# Altium integrated library Lattice CPLD ispLSI.IntLib: 471 symbols (part 9 of 26) (continued)
## ispLSI2096V-60LT128 (continued)

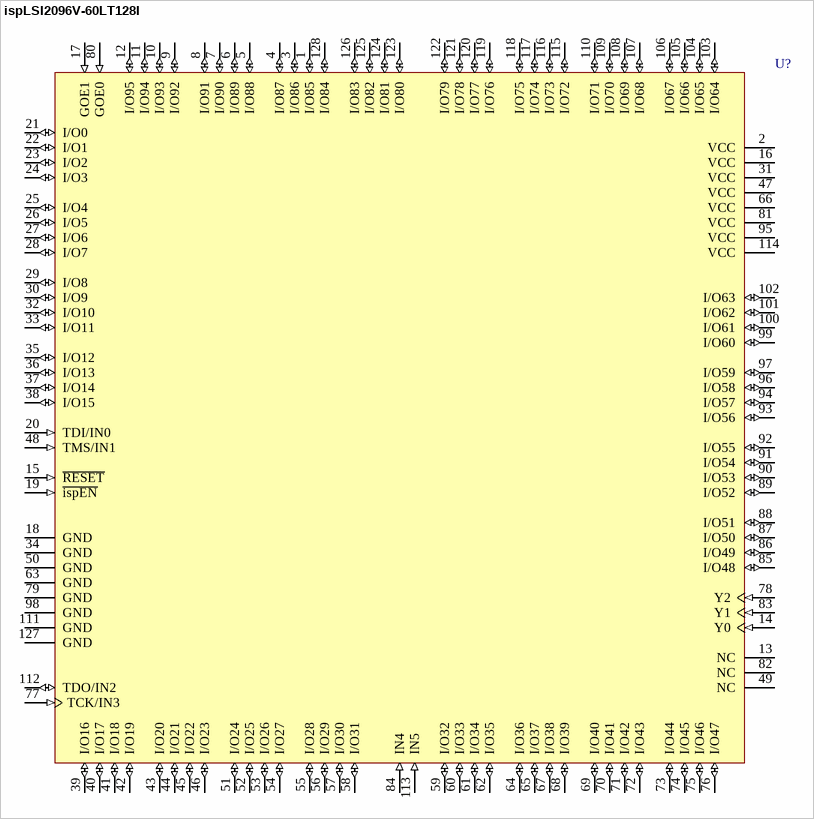
[diagram p70: symbol ispLSI2096V-60LT128I]

## ispLSI2096V-60LT128I
designator U?
3.3V High-Density Programmable Logic; Published: 23-Sep-2002; LatestRevisionDate: 13-Apr-2006; LatestRevisionNote: IPC-7351 Footprint Added.; DatasheetVersion: Feb-2000; PackageVersion: Aug-2005; PackageReference: TQFP128; Publisher: Altium Limited; PackageDescription: 128-Pin Thin Quad Flat Pack 0.4 mm Pitch; ComponentLink1Description: Manufacturer Link; ComponentLink1URL: http://www.latticesemi.com/products/mature/index.cfm; ComponentLink2Description: Datasheet; ComponentLink2URL: http://www.latticesemi.com/lit/docs/datasheets/cpld/2096v.pdf
footprint TQFP128_N (Thin QFP, 128-Leads, Body 14x14mm, Pitch 0.4mm, IPC Medium Density)
footprint TQFP128_L (Thin QFP, 128-Leads, Body 14x14mm, Pitch 0.4mm, IPC High Density)
footprint TQFP128_M (Thin QFP, 128-Leads, Body 14x14mm, Pitch 0.4mm, IPC Low Density)
3D model 2096V-TQFP128 (128-Pin Thin Quad Flat Pack 0.4 mm Pitch)
pins: 1 I/O85 (io), 2 VCC (power), 3 I/O86 (io), 4 I/O87 (io), 5 I/O88 (io), 6 I/O89 (io), 7 I/O90 (io), 8 I/O91 (io), 9 I/O92 (io), 10 I/O93 (io), 11 I/O94 (io), 12 I/O95 (io), 13 NC, 14 Y0 (in), 15 ~{RESET} (in), 16 VCC (power), 17 GOE1 (in), 18 GND (power), 19 ~{ispEN} (in), 20 TDI/IN0 (in), 21 I/O0 (io), 22 I/O1 (io), 23 I/O2 (io), 24 I/O3 (io), 25 I/O4 (io), 26 I/O5 (io), 27 I/O6 (io), 28 I/O7 (io), 29 I/O8 (io), 30 I/O9 (io), 31 VCC (power), 32 I/O10 (io), 33 I/O11 (io), 34 GND (power), 35 I/O12 (io), 36 I/O13 (io), 37 I/O14 (io), 38 I/O15 (io), 39 I/O16 (io), 40 I/O17 (io), 41 I/O18 (io), 42 I/O19 (io), 43 I/O20 (io), 44 I/O21 (io), 45 I/O22 (io), 46 I/O23 (io), 47 VCC (power), 48 TMS/IN1 (in), 49 NC, 50 GND (power), 51 I/O24 (io), 52 I/O25 (io), 53 I/O26 (io), 54 I/O27 (io), 55 I/O28 (io), 56 I/O29 (io), 57 I/O30 (io), 58 I/O31 (io), 59 I/O32 (io), 60 I/O33 (io), 61 I/O34 (io), 62 I/O35 (io), 63 GND (power), 64 I/O36 (io), 65 I/O37 (io), 66 VCC (power), 67 I/O38 (io), 68 I/O39 (io), 69 I/O40 (io), 70 I/O41 (io), 71 I/O42 (io), 72 I/O43 (io), 73 I/O44 (io), 74 I/O45 (io), 75 I/O46 (io), 76 I/O47 (io), 77 TCK/IN3 (in), 78 Y2 (in), 79 GND (power), 80 GOE0 (in), 81 VCC (power), 82 NC, 83 Y1 (in), 84 IN4 (in), 85 I/O48 (io), 86 I/O49 (io), 87 I/O50 (io), 88 I/O51 (io), 89 I/O52 (io), 90 I/O53 (io), 91 I/O54 (io), 92 I/O55 (io), 93 I/O56 (io), 94 I/O57 (io), 95 VCC (power), 96 I/O58 (io), 97 I/O59 (io), 98 GND (power), 99 I/O60 (io), 100 I/O61 (io), 101 I/O62 (io), 102 I/O63 (io), 103 I/O64 (io), 104 I/O65 (io), 105 I/O66 (io), 106 I/O67 (io), 107 I/O68 (io), 108 I/O69 (io), 109 I/O70 (io), 110 I/O71 (io), 111 GND (power), 112 TDO/IN2 (io), 113 IN5 (in), 114 VCC (power), 115 I/O72 (io), 116 I/O73 (io), 117 I/O74 (io), 118 I/O75 (io), 119 I/O76 (io), 120 I/O77 (io), 121 I/O78 (io), 122 I/O79 (io), 123 I/O80 (io), 124 I/O81 (io), 125 I/O82 (io), 126 I/O83 (io), 127 GND (power), 128 I/O84 (io)

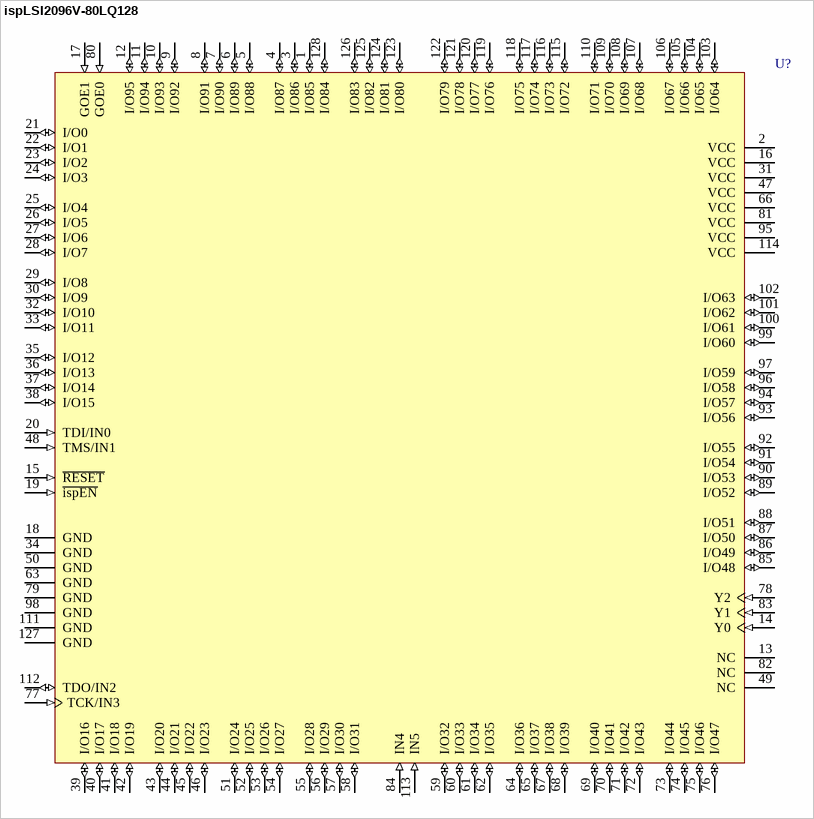
[diagram p71: symbol ispLSI2096V-80LQ128]

## ispLSI2096V-80LQ128
designator U?
3.3V High-Density Programmable Logic; Published: 23-Sep-2002; LatestRevisionDate: 13-Apr-2006; LatestRevisionNote: IPC-7351 Footprint Added.; DatasheetVersion: Feb-2000; PackageVersion: pkg_32, Aug-2005; PackageReference: PQFP128; Publisher: Altium Limited; PackageDescription: 128-Pin Quad Flat Pack 0.8 mm Pitch; Code_IPC: QFP80P3120X3120-128; ComponentLink1Description: Manufacturer Link; ComponentLink1URL: http://www.latticesemi.com/products/mature/index.cfm; ComponentLink2Description: Datasheet; ComponentLink2URL: http://www.latticesemi.com/lit/docs/datasheets/cpld/2096v.pdf
footprint PQFP128_N (QFP, 128-Leads, Body 28x28mm, Pitch 0.8mm, IPC Medium Density)
footprint PQFP128_L (QFP, 128-Leads, Body 28x28mm, Pitch 0.8mm, IPC High Density)
footprint PQFP128_M (QFP, 128-Leads, Body 28x28mm, Pitch 0.8mm, IPC Low Density)
3D model 2096V-PQFP128 (128-Pin Quad Flat Pack 0.8 mm Pitch)
pins: 1 I/O85 (io), 2 VCC (power), 3 I/O86 (io), 4 I/O87 (io), 5 I/O88 (io), 6 I/O89 (io), 7 I/O90 (io), 8 I/O91 (io), 9 I/O92 (io), 10 I/O93 (io), 11 I/O94 (io), 12 I/O95 (io), 13 NC, 14 Y0 (in), 15 ~{RESET} (in), 16 VCC (power), 17 GOE1 (in), 18 GND (power), 19 ~{ispEN} (in), 20 TDI/IN0 (in), 21 I/O0 (io), 22 I/O1 (io), 23 I/O2 (io), 24 I/O3 (io), 25 I/O4 (io), 26 I/O5 (io), 27 I/O6 (io), 28 I/O7 (io), 29 I/O8 (io), 30 I/O9 (io), 31 VCC (power), 32 I/O10 (io), 33 I/O11 (io), 34 GND (power), 35 I/O12 (io), 36 I/O13 (io), 37 I/O14 (io), 38 I/O15 (io), 39 I/O16 (io), 40 I/O17 (io), 41 I/O18 (io), 42 I/O19 (io), 43 I/O20 (io), 44 I/O21 (io), 45 I/O22 (io), 46 I/O23 (io), 47 VCC (power), 48 TMS/IN1 (in), 49 NC, 50 GND (power), 51 I/O24 (io), 52 I/O25 (io), 53 I/O26 (io), 54 I/O27 (io), 55 I/O28 (io), 56 I/O29 (io), 57 I/O30 (io), 58 I/O31 (io), 59 I/O32 (io), 60 I/O33 (io), 61 I/O34 (io), 62 I/O35 (io), 63 GND (power), 64 I/O36 (io), 65 I/O37 (io), 66 VCC (power), 67 I/O38 (io), 68 I/O39 (io), 69 I/O40 (io), 70 I/O41 (io), 71 I/O42 (io), 72 I/O43 (io), 73 I/O44 (io), 74 I/O45 (io), 75 I/O46 (io), 76 I/O47 (io), 77 TCK/IN3 (in), 78 Y2 (in), 79 GND (power), 80 GOE0 (in), 81 VCC (power), 82 NC, 83 Y1 (in), 84 IN4 (in), 85 I/O48 (io), 86 I/O49 (io), 87 I/O50 (io), 88 I/O51 (io), 89 I/O52 (io), 90 I/O53 (io), 91 I/O54 (io), 92 I/O55 (io), 93 I/O56 (io), 94 I/O57 (io), 95 VCC (power), 96 I/O58 (io), 97 I/O59 (io), 98 GND (power), 99 I/O60 (io), 100 I/O61 (io), 101 I/O62 (io), 102 I/O63 (io), 103 I/O64 (io), 104 I/O65 (io), 105 I/O66 (io), 106 I/O67 (io), 107 I/O68 (io), 108 I/O69 (io), 109 I/O70 (io), 110 I/O71 (io), 111 GND (power), 112 TDO/IN2 (io), 113 IN5 (in), 114 VCC (power), 115 I/O72 (io), 116 I/O73 (io), 117 I/O74 (io), 118 I/O75 (io), 119 I/O76 (io), 120 I/O77 (io), 121 I/O78 (io), 122 I/O79 (io), 123 I/O80 (io), 124 I/O81 (io), 125 I/O82 (io), 126 I/O83 (io), 127 GND (power), 128 I/O84 (io)

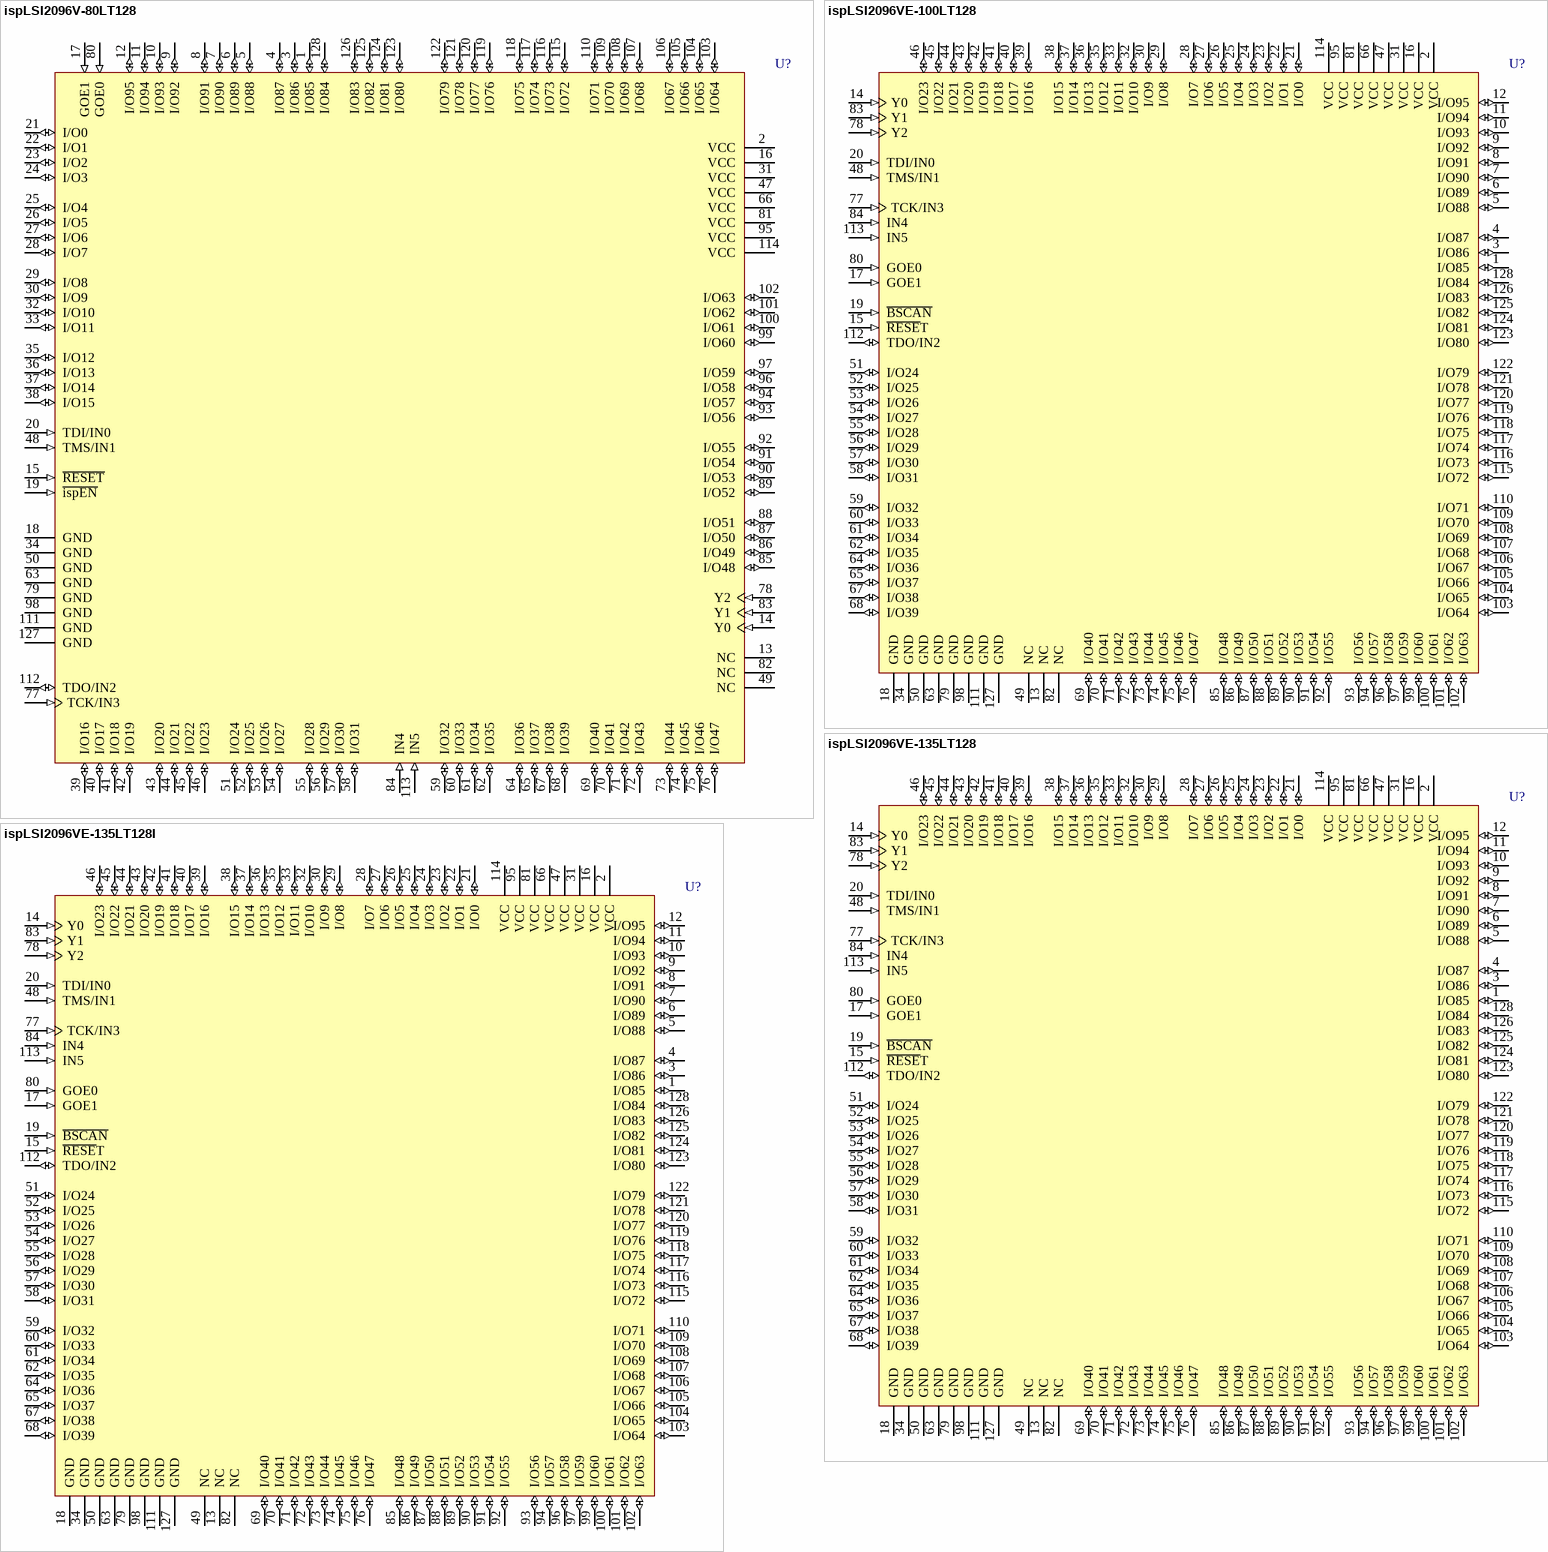
[diagram p72: symbols ispLSI2096V-80LT128 to ispLSI2096VE-135LT128I]

## ispLSI2096V-80LT128
designator U?
3.3V High-Density Programmable Logic; Published: 23-Sep-2002; LatestRevisionDate: 13-Apr-2006; LatestRevisionNote: IPC-7351 Footprint Added.; DatasheetVersion: Feb-2000; PackageVersion: Aug-2005; PackageReference: TQFP128; Publisher: Altium Limited; PackageDescription: 128-Pin Thin Quad Flat Pack 0.4 mm Pitch; ComponentLink1Description: Manufacturer Link; ComponentLink1URL: http://www.latticesemi.com/products/mature/index.cfm; ComponentLink2Description: Datasheet; ComponentLink2URL: http://www.latticesemi.com/lit/docs/datasheets/cpld/2096v.pdf
footprint TQFP128_N (Thin QFP, 128-Leads, Body 14x14mm, Pitch 0.4mm, IPC Medium Density)
footprint TQFP128_L (Thin QFP, 128-Leads, Body 14x14mm, Pitch 0.4mm, IPC High Density)
footprint TQFP128_M (Thin QFP, 128-Leads, Body 14x14mm, Pitch 0.4mm, IPC Low Density)
3D model 2096V-TQFP128 (128-Pin Thin Quad Flat Pack 0.4 mm Pitch)
pins: 1 I/O85 (io), 2 VCC (power), 3 I/O86 (io), 4 I/O87 (io), 5 I/O88 (io), 6 I/O89 (io), 7 I/O90 (io), 8 I/O91 (io), 9 I/O92 (io), 10 I/O93 (io), 11 I/O94 (io), 12 I/O95 (io), 13 NC, 14 Y0 (in), 15 ~{RESET} (in), 16 VCC (power), 17 GOE1 (in), 18 GND (power), 19 ~{ispEN} (in), 20 TDI/IN0 (in), 21 I/O0 (io), 22 I/O1 (io), 23 I/O2 (io), 24 I/O3 (io), 25 I/O4 (io), 26 I/O5 (io), 27 I/O6 (io), 28 I/O7 (io), 29 I/O8 (io), 30 I/O9 (io), 31 VCC (power), 32 I/O10 (io), 33 I/O11 (io), 34 GND (power), 35 I/O12 (io), 36 I/O13 (io), 37 I/O14 (io), 38 I/O15 (io), 39 I/O16 (io), 40 I/O17 (io), 41 I/O18 (io), 42 I/O19 (io), 43 I/O20 (io), 44 I/O21 (io), 45 I/O22 (io), 46 I/O23 (io), 47 VCC (power), 48 TMS/IN1 (in), 49 NC, 50 GND (power), 51 I/O24 (io), 52 I/O25 (io), 53 I/O26 (io), 54 I/O27 (io), 55 I/O28 (io), 56 I/O29 (io), 57 I/O30 (io), 58 I/O31 (io), 59 I/O32 (io), 60 I/O33 (io), 61 I/O34 (io), 62 I/O35 (io), 63 GND (power), 64 I/O36 (io), 65 I/O37 (io), 66 VCC (power), 67 I/O38 (io), 68 I/O39 (io), 69 I/O40 (io), 70 I/O41 (io), 71 I/O42 (io), 72 I/O43 (io), 73 I/O44 (io), 74 I/O45 (io), 75 I/O46 (io), 76 I/O47 (io), 77 TCK/IN3 (in), 78 Y2 (in), 79 GND (power), 80 GOE0 (in), 81 VCC (power), 82 NC, 83 Y1 (in), 84 IN4 (in), 85 I/O48 (io), 86 I/O49 (io), 87 I/O50 (io), 88 I/O51 (io), 89 I/O52 (io), 90 I/O53 (io), 91 I/O54 (io), 92 I/O55 (io), 93 I/O56 (io), 94 I/O57 (io), 95 VCC (power), 96 I/O58 (io), 97 I/O59 (io), 98 GND (power), 99 I/O60 (io), 100 I/O61 (io), 101 I/O62 (io), 102 I/O63 (io), 103 I/O64 (io), 104 I/O65 (io), 105 I/O66 (io), 106 I/O67 (io), 107 I/O68 (io), 108 I/O69 (io), 109 I/O70 (io), 110 I/O71 (io), 111 GND (power), 112 TDO/IN2 (io), 113 IN5 (in), 114 VCC (power), 115 I/O72 (io), 116 I/O73 (io), 117 I/O74 (io), 118 I/O75 (io), 119 I/O76 (io), 120 I/O77 (io), 121 I/O78 (io), 122 I/O79 (io), 123 I/O80 (io), 124 I/O81 (io), 125 I/O82 (io), 126 I/O83 (io), 127 GND (power), 128 I/O84 (io)

## ispLSI2096VE-100LT128
designator U?
3.3V In-System Programmable SuperFAST High Density PLD; Published: 17-Jul-2002; LatestRevisionDate: 13-Apr-2006; LatestRevisionNote: IPC-7351 Footprint Added.; DatasheetVersion: Jan-2001; PackageVersion: Aug-2005; PackageReference: TQFP128; Publisher: Altium Limited; PackageDescription: 128-Pin Thin Quad Flat Pack 0.4 mm Pitch; ComponentLink1Description: Manufacturer Link; ComponentLink1URL: http://www.latticesemi.com/products/mature/index.cfm; ComponentLink2Description: Datasheet; ComponentLink2URL: http://www.latticesemi.com/account/_download.cfm?AMID=710
footprint TQFP128_N (Thin QFP, 128-Leads, Body 14x14mm, Pitch 0.4mm, IPC Medium Density)
footprint TQFP128_L (Thin QFP, 128-Leads, Body 14x14mm, Pitch 0.4mm, IPC High Density)
footprint TQFP128_M (Thin QFP, 128-Leads, Body 14x14mm, Pitch 0.4mm, IPC Low Density)
3D model 2096VE-TQFP128 (128-Pin Thin Quad Flat Pack 0.4 mm Pitch)
pins: 1 I/O85 (io), 2 VCC (power), 3 I/O86 (io), 4 I/O87 (io), 5 I/O88 (io), 6 I/O89 (io), 7 I/O90 (io), 8 I/O91 (io), 9 I/O92 (io), 10 I/O93 (io), 11 I/O94 (io), 12 I/O95 (io), 13 NC, 14 Y0 (in), 15 ~{RESE}T (in), 16 VCC (power), 17 GOE1 (in), 18 GND (power), 19 ~{BSCAN} (in), 20 TDI/IN0 (in), 21 I/O0 (io), 22 I/O1 (io), 23 I/O2 (io), 24 I/O3 (io), 25 I/O4 (io), 26 I/O5 (io), 27 I/O6 (io), 28 I/O7 (io), 29 I/O8 (io), 30 I/O9 (io), 31 VCC (power), 32 I/O10 (io), 33 I/O11 (io), 34 GND (power), 35 I/O12 (io), 36 I/O13 (io), 37 I/O14 (io), 38 I/O15 (io), 39 I/O16 (io), 40 I/O17 (io), 41 I/O18 (io), 42 I/O19 (io), 43 I/O20 (io), 44 I/O21 (io), 45 I/O22 (io), 46 I/O23 (io), 47 VCC (power), 48 TMS/IN1 (in), 49 NC, 50 GND (power), 51 I/O24 (io), 52 I/O25 (io), 53 I/O26 (io), 54 I/O27 (io), 55 I/O28 (io), 56 I/O29 (io), 57 I/O30 (io), 58 I/O31 (io), 59 I/O32 (io), 60 I/O33 (io), 61 I/O34 (io), 62 I/O35 (io), 63 GND (power), 64 I/O36 (io), 65 I/O37 (io), 66 VCC (power), 67 I/O38 (io), 68 I/O39 (io), 69 I/O40 (io), 70 I/O41 (io), 71 I/O42 (io), 72 I/O43 (io), 73 I/O44 (io), 74 I/O45 (io), 75 I/O46 (io), 76 I/O47 (io), 77 TCK/IN3 (in), 78 Y2 (in), 79 GND (power), 80 GOE0 (in), 81 VCC (power), 82 NC, 83 Y1 (in), 84 IN4 (in), 85 I/O48 (io), 86 I/O49 (io), 87 I/O50 (io), 88 I/O51 (io), 89 I/O52 (io), 90 I/O53 (io), 91 I/O54 (io), 92 I/O55 (io), 93 I/O56 (io), 94 I/O57 (io), 95 VCC (power), 96 I/O58 (io), 97 I/O59 (io), 98 GND (power), 99 I/O60 (io), 100 I/O61 (io), 101 I/O62 (io), 102 I/O63 (io), 103 I/O64 (io), 104 I/O65 (io), 105 I/O66 (io), 106 I/O67 (io), 107 I/O68 (io), 108 I/O69 (io), 109 I/O70 (io), 110 I/O71 (io), 111 GND (power), 112 TDO/IN2 (io), 113 IN5 (in), 114 VCC (power), 115 I/O72 (io), 116 I/O73 (io), 117 I/O74 (io), 118 I/O75 (io), 119 I/O76 (io), 120 I/O77 (io), 121 I/O78 (io), 122 I/O79 (io), 123 I/O80 (io), 124 I/O81 (io), 125 I/O82 (io), 126 I/O83 (io), 127 GND (power), 128 I/O84 (io)

## ispLSI2096VE-135LT128
designator U?
3.3V In-System Programmable SuperFAST High Density PLD; Published: 17-Jul-2002; LatestRevisionDate: 13-Apr-2006; LatestRevisionNote: IPC-7351 Footprint Added.; DatasheetVersion: Jan-2001; PackageVersion: Aug-2005; PackageReference: TQFP128; Publisher: Altium Limited; PackageDescription: 128-Pin Thin Quad Flat Pack 0.4 mm Pitch; ComponentLink1Description: Manufacturer Link; ComponentLink1URL: http://www.latticesemi.com/products/mature/index.cfm; ComponentLink2Description: Datasheet; ComponentLink2URL: http://www.latticesemi.com/account/_download.cfm?AMID=710
footprint TQFP128_N (Thin QFP, 128-Leads, Body 14x14mm, Pitch 0.4mm, IPC Medium Density)
footprint TQFP128_L (Thin QFP, 128-Leads, Body 14x14mm, Pitch 0.4mm, IPC High Density)
footprint TQFP128_M (Thin QFP, 128-Leads, Body 14x14mm, Pitch 0.4mm, IPC Low Density)
3D model 2096VE-TQFP128 (128-Pin Thin Quad Flat Pack 0.4 mm Pitch)
pins: 1 I/O85 (io), 2 VCC (power), 3 I/O86 (io), 4 I/O87 (io), 5 I/O88 (io), 6 I/O89 (io), 7 I/O90 (io), 8 I/O91 (io), 9 I/O92 (io), 10 I/O93 (io), 11 I/O94 (io), 12 I/O95 (io), 13 NC, 14 Y0 (in), 15 ~{RESE}T (in), 16 VCC (power), 17 GOE1 (in), 18 GND (power), 19 ~{BSCAN} (in), 20 TDI/IN0 (in), 21 I/O0 (io), 22 I/O1 (io), 23 I/O2 (io), 24 I/O3 (io), 25 I/O4 (io), 26 I/O5 (io), 27 I/O6 (io), 28 I/O7 (io), 29 I/O8 (io), 30 I/O9 (io), 31 VCC (power), 32 I/O10 (io), 33 I/O11 (io), 34 GND (power), 35 I/O12 (io), 36 I/O13 (io), 37 I/O14 (io), 38 I/O15 (io), 39 I/O16 (io), 40 I/O17 (io), 41 I/O18 (io), 42 I/O19 (io), 43 I/O20 (io), 44 I/O21 (io), 45 I/O22 (io), 46 I/O23 (io), 47 VCC (power), 48 TMS/IN1 (in), 49 NC, 50 GND (power), 51 I/O24 (io), 52 I/O25 (io), 53 I/O26 (io), 54 I/O27 (io), 55 I/O28 (io), 56 I/O29 (io), 57 I/O30 (io), 58 I/O31 (io), 59 I/O32 (io), 60 I/O33 (io), 61 I/O34 (io), 62 I/O35 (io), 63 GND (power), 64 I/O36 (io), 65 I/O37 (io), 66 VCC (power), 67 I/O38 (io), 68 I/O39 (io), 69 I/O40 (io), 70 I/O41 (io), 71 I/O42 (io), 72 I/O43 (io), 73 I/O44 (io), 74 I/O45 (io), 75 I/O46 (io), 76 I/O47 (io), 77 TCK/IN3 (in), 78 Y2 (in), 79 GND (power), 80 GOE0 (in), 81 VCC (power), 82 NC, 83 Y1 (in), 84 IN4 (in), 85 I/O48 (io), 86 I/O49 (io), 87 I/O50 (io), 88 I/O51 (io), 89 I/O52 (io), 90 I/O53 (io), 91 I/O54 (io), 92 I/O55 (io), 93 I/O56 (io), 94 I/O57 (io), 95 VCC (power), 96 I/O58 (io), 97 I/O59 (io), 98 GND (power), 99 I/O60 (io), 100 I/O61 (io), 101 I/O62 (io), 102 I/O63 (io), 103 I/O64 (io), 104 I/O65 (io), 105 I/O66 (io), 106 I/O67 (io), 107 I/O68 (io), 108 I/O69 (io), 109 I/O70 (io), 110 I/O71 (io), 111 GND (power), 112 TDO/IN2 (io), 113 IN5 (in), 114 VCC (power), 115 I/O72 (io), 116 I/O73 (io), 117 I/O74 (io), 118 I/O75 (io), 119 I/O76 (io), 120 I/O77 (io), 121 I/O78 (io), 122 I/O79 (io), 123 I/O80 (io), 124 I/O81 (io), 125 I/O82 (io), 126 I/O83 (io), 127 GND (power), 128 I/O84 (io)

## ispLSI2096VE-135LT128I
designator U?
3.3V In-System Programmable SuperFAST High Density PLD; Published: 17-Jul-2002; LatestRevisionDate: 13-Apr-2006; LatestRevisionNote: IPC-7351 Footprint Added.; DatasheetVersion: Jan-2001; PackageVersion: Aug-2005; PackageReference: TQFP128; Publisher: Altium Limited; PackageDescription: 128-Pin Thin Quad Flat Pack 0.4 mm Pitch; ComponentLink1Description: Manufacturer Link; ComponentLink1URL: http://www.latticesemi.com/products/mature/index.cfm; ComponentLink2Description: Datasheet; ComponentLink2URL: http://www.latticesemi.com/account/_download.cfm?AMID=710
footprint TQFP128_N (Thin QFP, 128-Leads, Body 14x14mm, Pitch 0.4mm, IPC Medium Density)
footprint TQFP128_L (Thin QFP, 128-Leads, Body 14x14mm, Pitch 0.4mm, IPC High Density)
footprint TQFP128_M (Thin QFP, 128-Leads, Body 14x14mm, Pitch 0.4mm, IPC Low Density)
3D model 2096VE-TQFP128 (128-Pin Thin Quad Flat Pack 0.4 mm Pitch)
pins: 1 I/O85 (io), 2 VCC (power), 3 I/O86 (io), 4 I/O87 (io), 5 I/O88 (io), 6 I/O89 (io), 7 I/O90 (io), 8 I/O91 (io), 9 I/O92 (io), 10 I/O93 (io), 11 I/O94 (io), 12 I/O95 (io), 13 NC, 14 Y0 (in), 15 ~{RESE}T (in), 16 VCC (power), 17 GOE1 (in), 18 GND (power), 19 ~{BSCAN} (in), 20 TDI/IN0 (in), 21 I/O0 (io), 22 I/O1 (io), 23 I/O2 (io), 24 I/O3 (io), 25 I/O4 (io), 26 I/O5 (io), 27 I/O6 (io), 28 I/O7 (io), 29 I/O8 (io), 30 I/O9 (io), 31 VCC (power), 32 I/O10 (io), 33 I/O11 (io), 34 GND (power), 35 I/O12 (io), 36 I/O13 (io), 37 I/O14 (io), 38 I/O15 (io), 39 I/O16 (io), 40 I/O17 (io), 41 I/O18 (io), 42 I/O19 (io), 43 I/O20 (io), 44 I/O21 (io), 45 I/O22 (io), 46 I/O23 (io), 47 VCC (power), 48 TMS/IN1 (in), 49 NC, 50 GND (power), 51 I/O24 (io), 52 I/O25 (io), 53 I/O26 (io), 54 I/O27 (io), 55 I/O28 (io), 56 I/O29 (io), 57 I/O30 (io), 58 I/O31 (io), 59 I/O32 (io), 60 I/O33 (io), 61 I/O34 (io), 62 I/O35 (io), 63 GND (power), 64 I/O36 (io), 65 I/O37 (io), 66 VCC (power), 67 I/O38 (io), 68 I/O39 (io), 69 I/O40 (io), 70 I/O41 (io), 71 I/O42 (io), 72 I/O43 (io), 73 I/O44 (io), 74 I/O45 (io), 75 I/O46 (io), 76 I/O47 (io), 77 TCK/IN3 (in), 78 Y2 (in), 79 GND (power), 80 GOE0 (in), 81 VCC (power), 82 NC, 83 Y1 (in), 84 IN4 (in), 85 I/O48 (io), 86 I/O49 (io), 87 I/O50 (io), 88 I/O51 (io), 89 I/O52 (io), 90 I/O53 (io), 91 I/O54 (io), 92 I/O55 (io), 93 I/O56 (io), 94 I/O57 (io), 95 VCC (power), 96 I/O58 (io), 97 I/O59 (io), 98 GND (power), 99 I/O60 (io), 100 I/O61 (io), 101 I/O62 (io), 102 I/O63 (io), 103 I/O64 (io), 104 I/O65 (io), 105 I/O66 (io), 106 I/O67 (io), 107 I/O68 (io), 108 I/O69 (io), 109 I/O70 (io), 110 I/O71 (io), 111 GND (power), 112 TDO/IN2 (io), 113 IN5 (in), 114 VCC (power), 115 I/O72 (io), 116 I/O73 (io), 117 I/O74 (io), 118 I/O75 (io), 119 I/O76 (io), 120 I/O77 (io), 121 I/O78 (io), 122 I/O79 (io), 123 I/O80 (io), 124 I/O81 (io), 125 I/O82 (io), 126 I/O83 (io), 127 GND (power), 128 I/O84 (io)

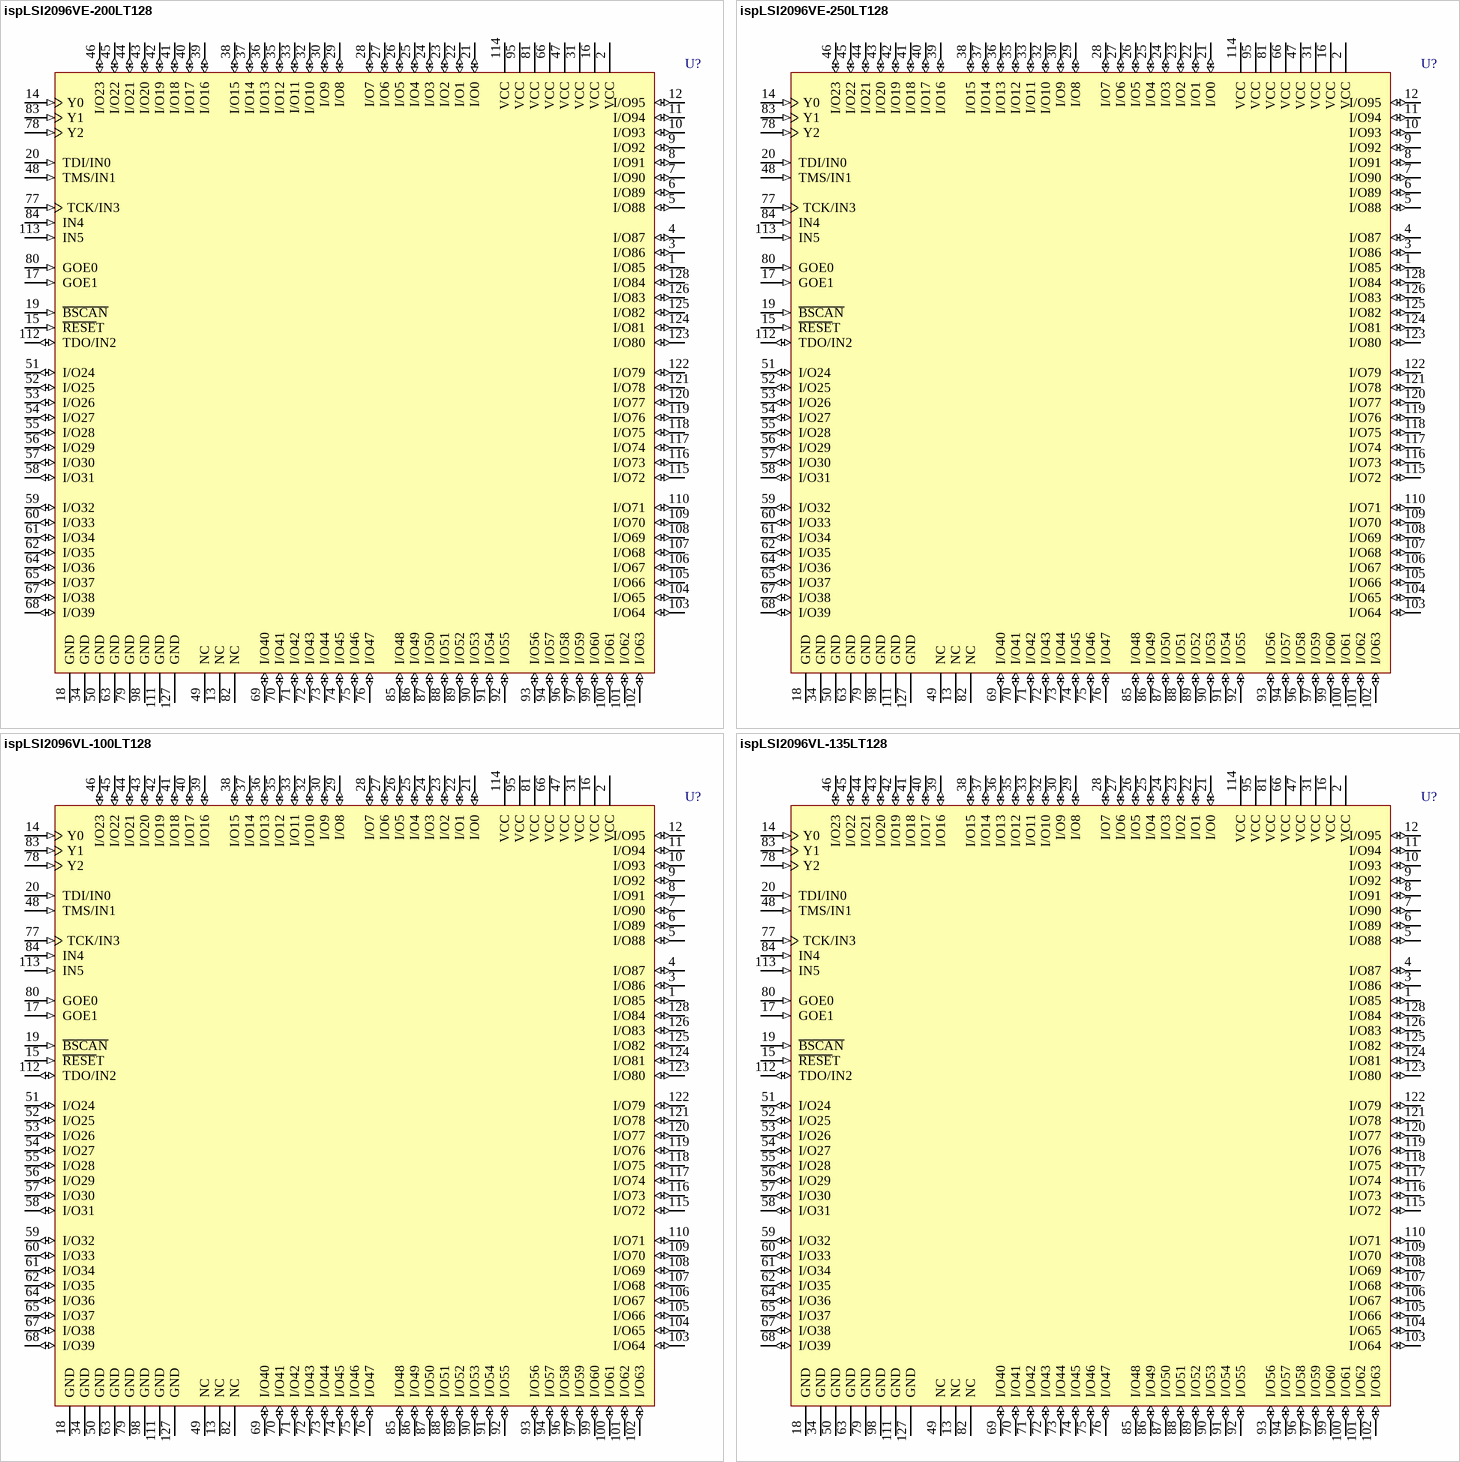
[diagram p73: symbols ispLSI2096VE-200LT128 to ispLSI2096VL-135LT128]

## ispLSI2096VE-200LT128
designator U?
3.3V In-System Programmable SuperFAST High Density PLD; Published: 17-Jul-2002; LatestRevisionDate: 13-Apr-2006; LatestRevisionNote: IPC-7351 Footprint Added.; DatasheetVersion: Jan-2001; PackageVersion: Aug-2005; PackageReference: TQFP128; Publisher: Altium Limited; PackageDescription: 128-Pin Thin Quad Flat Pack 0.4 mm Pitch; ComponentLink1Description: Manufacturer Link; ComponentLink1URL: http://www.latticesemi.com/products/mature/index.cfm; ComponentLink2Description: Datasheet; ComponentLink2URL: http://www.latticesemi.com/account/_download.cfm?AMID=710
footprint TQFP128_N (Thin QFP, 128-Leads, Body 14x14mm, Pitch 0.4mm, IPC Medium Density)
footprint TQFP128_L (Thin QFP, 128-Leads, Body 14x14mm, Pitch 0.4mm, IPC High Density)
footprint TQFP128_M (Thin QFP, 128-Leads, Body 14x14mm, Pitch 0.4mm, IPC Low Density)
3D model 2096VE-TQFP128 (128-Pin Thin Quad Flat Pack 0.4 mm Pitch)
pins: 1 I/O85 (io), 2 VCC (power), 3 I/O86 (io), 4 I/O87 (io), 5 I/O88 (io), 6 I/O89 (io), 7 I/O90 (io), 8 I/O91 (io), 9 I/O92 (io), 10 I/O93 (io), 11 I/O94 (io), 12 I/O95 (io), 13 NC, 14 Y0 (in), 15 ~{RESE}T (in), 16 VCC (power), 17 GOE1 (in), 18 GND (power), 19 ~{BSCAN} (in), 20 TDI/IN0 (in), 21 I/O0 (io), 22 I/O1 (io), 23 I/O2 (io), 24 I/O3 (io), 25 I/O4 (io), 26 I/O5 (io), 27 I/O6 (io), 28 I/O7 (io), 29 I/O8 (io), 30 I/O9 (io), 31 VCC (power), 32 I/O10 (io), 33 I/O11 (io), 34 GND (power), 35 I/O12 (io), 36 I/O13 (io), 37 I/O14 (io), 38 I/O15 (io), 39 I/O16 (io), 40 I/O17 (io), 41 I/O18 (io), 42 I/O19 (io), 43 I/O20 (io), 44 I/O21 (io), 45 I/O22 (io), 46 I/O23 (io), 47 VCC (power), 48 TMS/IN1 (in), 49 NC, 50 GND (power), 51 I/O24 (io), 52 I/O25 (io), 53 I/O26 (io), 54 I/O27 (io), 55 I/O28 (io), 56 I/O29 (io), 57 I/O30 (io), 58 I/O31 (io), 59 I/O32 (io), 60 I/O33 (io), 61 I/O34 (io), 62 I/O35 (io), 63 GND (power), 64 I/O36 (io), 65 I/O37 (io), 66 VCC (power), 67 I/O38 (io), 68 I/O39 (io), 69 I/O40 (io), 70 I/O41 (io), 71 I/O42 (io), 72 I/O43 (io), 73 I/O44 (io), 74 I/O45 (io), 75 I/O46 (io), 76 I/O47 (io), 77 TCK/IN3 (in), 78 Y2 (in), 79 GND (power), 80 GOE0 (in), 81 VCC (power), 82 NC, 83 Y1 (in), 84 IN4 (in), 85 I/O48 (io), 86 I/O49 (io), 87 I/O50 (io), 88 I/O51 (io), 89 I/O52 (io), 90 I/O53 (io), 91 I/O54 (io), 92 I/O55 (io), 93 I/O56 (io), 94 I/O57 (io), 95 VCC (power), 96 I/O58 (io), 97 I/O59 (io), 98 GND (power), 99 I/O60 (io), 100 I/O61 (io), 101 I/O62 (io), 102 I/O63 (io), 103 I/O64 (io), 104 I/O65 (io), 105 I/O66 (io), 106 I/O67 (io), 107 I/O68 (io), 108 I/O69 (io), 109 I/O70 (io), 110 I/O71 (io), 111 GND (power), 112 TDO/IN2 (io), 113 IN5 (in), 114 VCC (power), 115 I/O72 (io), 116 I/O73 (io), 117 I/O74 (io), 118 I/O75 (io), 119 I/O76 (io), 120 I/O77 (io), 121 I/O78 (io), 122 I/O79 (io), 123 I/O80 (io), 124 I/O81 (io), 125 I/O82 (io), 126 I/O83 (io), 127 GND (power), 128 I/O84 (io)

## ispLSI2096VE-250LT128
designator U?
3.3V In-System Programmable SuperFAST High Density PLD; Published: 17-Jul-2002; LatestRevisionDate: 13-Apr-2006; LatestRevisionNote: IPC-7351 Footprint Added.; DatasheetVersion: Jan-2001; PackageVersion: Aug-2005; PackageReference: TQFP128; Publisher: Altium Limited; PackageDescription: 128-Pin Thin Quad Flat Pack 0.4 mm Pitch; ComponentLink1Description: Manufacturer Link; ComponentLink1URL: http://www.latticesemi.com/products/mature/index.cfm; ComponentLink2Description: Datasheet; ComponentLink2URL: http://www.latticesemi.com/account/_download.cfm?AMID=710
footprint TQFP128_N (Thin QFP, 128-Leads, Body 14x14mm, Pitch 0.4mm, IPC Medium Density)
footprint TQFP128_L (Thin QFP, 128-Leads, Body 14x14mm, Pitch 0.4mm, IPC High Density)
footprint TQFP128_M (Thin QFP, 128-Leads, Body 14x14mm, Pitch 0.4mm, IPC Low Density)
3D model 2096VE-TQFP128 (128-Pin Thin Quad Flat Pack 0.4 mm Pitch)
pins: 1 I/O85 (io), 2 VCC (power), 3 I/O86 (io), 4 I/O87 (io), 5 I/O88 (io), 6 I/O89 (io), 7 I/O90 (io), 8 I/O91 (io), 9 I/O92 (io), 10 I/O93 (io), 11 I/O94 (io), 12 I/O95 (io), 13 NC, 14 Y0 (in), 15 ~{RESE}T (in), 16 VCC (power), 17 GOE1 (in), 18 GND (power), 19 ~{BSCAN} (in), 20 TDI/IN0 (in), 21 I/O0 (io), 22 I/O1 (io), 23 I/O2 (io), 24 I/O3 (io), 25 I/O4 (io), 26 I/O5 (io), 27 I/O6 (io), 28 I/O7 (io), 29 I/O8 (io), 30 I/O9 (io), 31 VCC (power), 32 I/O10 (io), 33 I/O11 (io), 34 GND (power), 35 I/O12 (io), 36 I/O13 (io), 37 I/O14 (io), 38 I/O15 (io), 39 I/O16 (io), 40 I/O17 (io), 41 I/O18 (io), 42 I/O19 (io), 43 I/O20 (io), 44 I/O21 (io), 45 I/O22 (io), 46 I/O23 (io), 47 VCC (power), 48 TMS/IN1 (in), 49 NC, 50 GND (power), 51 I/O24 (io), 52 I/O25 (io), 53 I/O26 (io), 54 I/O27 (io), 55 I/O28 (io), 56 I/O29 (io), 57 I/O30 (io), 58 I/O31 (io), 59 I/O32 (io), 60 I/O33 (io), 61 I/O34 (io), 62 I/O35 (io), 63 GND (power), 64 I/O36 (io), 65 I/O37 (io), 66 VCC (power), 67 I/O38 (io), 68 I/O39 (io), 69 I/O40 (io), 70 I/O41 (io), 71 I/O42 (io), 72 I/O43 (io), 73 I/O44 (io), 74 I/O45 (io), 75 I/O46 (io), 76 I/O47 (io), 77 TCK/IN3 (in), 78 Y2 (in), 79 GND (power), 80 GOE0 (in), 81 VCC (power), 82 NC, 83 Y1 (in), 84 IN4 (in), 85 I/O48 (io), 86 I/O49 (io), 87 I/O50 (io), 88 I/O51 (io), 89 I/O52 (io), 90 I/O53 (io), 91 I/O54 (io), 92 I/O55 (io), 93 I/O56 (io), 94 I/O57 (io), 95 VCC (power), 96 I/O58 (io), 97 I/O59 (io), 98 GND (power), 99 I/O60 (io), 100 I/O61 (io), 101 I/O62 (io), 102 I/O63 (io), 103 I/O64 (io), 104 I/O65 (io), 105 I/O66 (io), 106 I/O67 (io), 107 I/O68 (io), 108 I/O69 (io), 109 I/O70 (io), 110 I/O71 (io), 111 GND (power), 112 TDO/IN2 (io), 113 IN5 (in), 114 VCC (power), 115 I/O72 (io), 116 I/O73 (io), 117 I/O74 (io), 118 I/O75 (io), 119 I/O76 (io), 120 I/O77 (io), 121 I/O78 (io), 122 I/O79 (io), 123 I/O80 (io), 124 I/O81 (io), 125 I/O82 (io), 126 I/O83 (io), 127 GND (power), 128 I/O84 (io)

## ispLSI2096VL-100LT128
designator U?
2.5V In-System Programmable SuperFAST High Density PLD; Published: 17-Jul-2002; LatestRevisionDate: 13-Apr-2006; LatestRevisionNote: IPC-7351 Footprint Added.; DatasheetVersion: Sep-2000; PackageVersion: Aug-2005; PackageReference: TQFP128; Publisher: Altium Limited; PackageDescription: 128-Pin Thin Quad Flat Pack 0.4 mm Pitch; ComponentLink1Description: Manufacturer Link; ComponentLink1URL: http://www.latticesemi.com/products/mature/index.cfm; ComponentLink2Description: Datasheet; ComponentLink2URL: http://www.latticesemi.com/lit/docs/datasheets/cpld/2096vl.pdf
footprint TQFP128_N (Thin QFP, 128-Leads, Body 14x14mm, Pitch 0.4mm, IPC Medium Density)
footprint TQFP128_L (Thin QFP, 128-Leads, Body 14x14mm, Pitch 0.4mm, IPC High Density)
footprint TQFP128_M (Thin QFP, 128-Leads, Body 14x14mm, Pitch 0.4mm, IPC Low Density)
3D model 2096VL-TQFP128 (128-Pin Thin Quad Flat Pack 0.4 mm Pitch)
pins: 1 I/O85 (io), 2 VCC (power), 3 I/O86 (io), 4 I/O87 (io), 5 I/O88 (io), 6 I/O89 (io), 7 I/O90 (io), 8 I/O91 (io), 9 I/O92 (io), 10 I/O93 (io), 11 I/O94 (io), 12 I/O95 (io), 13 NC, 14 Y0 (in), 15 ~{RESE}T (in), 16 VCC (power), 17 GOE1 (in), 18 GND (power), 19 ~{BSCAN} (in), 20 TDI/IN0 (in), 21 I/O0 (io), 22 I/O1 (io), 23 I/O2 (io), 24 I/O3 (io), 25 I/O4 (io), 26 I/O5 (io), 27 I/O6 (io), 28 I/O7 (io), 29 I/O8 (io), 30 I/O9 (io), 31 VCC (power), 32 I/O10 (io), 33 I/O11 (io), 34 GND (power), 35 I/O12 (io), 36 I/O13 (io), 37 I/O14 (io), 38 I/O15 (io), 39 I/O16 (io), 40 I/O17 (io), 41 I/O18 (io), 42 I/O19 (io), 43 I/O20 (io), 44 I/O21 (io), 45 I/O22 (io), 46 I/O23 (io), 47 VCC (power), 48 TMS/IN1 (in), 49 NC, 50 GND (power), 51 I/O24 (io), 52 I/O25 (io), 53 I/O26 (io), 54 I/O27 (io), 55 I/O28 (io), 56 I/O29 (io), 57 I/O30 (io), 58 I/O31 (io), 59 I/O32 (io), 60 I/O33 (io), 61 I/O34 (io), 62 I/O35 (io), 63 GND (power), 64 I/O36 (io), 65 I/O37 (io), 66 VCC (power), 67 I/O38 (io), 68 I/O39 (io), 69 I/O40 (io), 70 I/O41 (io), 71 I/O42 (io), 72 I/O43 (io), 73 I/O44 (io), 74 I/O45 (io), 75 I/O46 (io), 76 I/O47 (io), 77 TCK/IN3 (in), 78 Y2 (in), 79 GND (power), 80 GOE0 (in), 81 VCC (power), 82 NC, 83 Y1 (in), 84 IN4 (in), 85 I/O48 (io), 86 I/O49 (io), 87 I/O50 (io), 88 I/O51 (io), 89 I/O52 (io), 90 I/O53 (io), 91 I/O54 (io), 92 I/O55 (io), 93 I/O56 (io), 94 I/O57 (io), 95 VCC (power), 96 I/O58 (io), 97 I/O59 (io), 98 GND (power), 99 I/O60 (io), 100 I/O61 (io), 101 I/O62 (io), 102 I/O63 (io), 103 I/O64 (io), 104 I/O65 (io), 105 I/O66 (io), 106 I/O67 (io), 107 I/O68 (io), 108 I/O69 (io), 109 I/O70 (io), 110 I/O71 (io), 111 GND (power), 112 TDO/IN2 (io), 113 IN5 (in), 114 VCC (power), 115 I/O72 (io), 116 I/O73 (io), 117 I/O74 (io), 118 I/O75 (io), 119 I/O76 (io), 120 I/O77 (io), 121 I/O78 (io), 122 I/O79 (io), 123 I/O80 (io), 124 I/O81 (io), 125 I/O82 (io), 126 I/O83 (io), 127 GND (power), 128 I/O84 (io)

## ispLSI2096VL-135LT128
designator U?
2.5V In-System Programmable SuperFAST High Density PLD; Published: 17-Jul-2002; LatestRevisionDate: 13-Apr-2006; LatestRevisionNote: IPC-7351 Footprint Added.; DatasheetVersion: Sep-2000; PackageVersion: Aug-2005; PackageReference: TQFP128; Publisher: Altium Limited; PackageDescription: 128-Pin Thin Quad Flat Pack 0.4 mm Pitch; ComponentLink1Description: Manufacturer Link; ComponentLink1URL: http://www.latticesemi.com/products/mature/index.cfm; ComponentLink2Description: Datasheet; ComponentLink2URL: http://www.latticesemi.com/lit/docs/datasheets/cpld/2096vl.pdf
footprint TQFP128_N (Thin QFP, 128-Leads, Body 14x14mm, Pitch 0.4mm, IPC Medium Density)
footprint TQFP128_L (Thin QFP, 128-Leads, Body 14x14mm, Pitch 0.4mm, IPC High Density)
footprint TQFP128_M (Thin QFP, 128-Leads, Body 14x14mm, Pitch 0.4mm, IPC Low Density)
3D model 2096VL-TQFP128 (128-Pin Thin Quad Flat Pack 0.4 mm Pitch)
pins: 1 I/O85 (io), 2 VCC (power), 3 I/O86 (io), 4 I/O87 (io), 5 I/O88 (io), 6 I/O89 (io), 7 I/O90 (io), 8 I/O91 (io), 9 I/O92 (io), 10 I/O93 (io), 11 I/O94 (io), 12 I/O95 (io), 13 NC, 14 Y0 (in), 15 ~{RESE}T (in), 16 VCC (power), 17 GOE1 (in), 18 GND (power), 19 ~{BSCAN} (in), 20 TDI/IN0 (in), 21 I/O0 (io), 22 I/O1 (io), 23 I/O2 (io), 24 I/O3 (io), 25 I/O4 (io), 26 I/O5 (io), 27 I/O6 (io), 28 I/O7 (io), 29 I/O8 (io), 30 I/O9 (io), 31 VCC (power), 32 I/O10 (io), 33 I/O11 (io), 34 GND (power), 35 I/O12 (io), 36 I/O13 (io), 37 I/O14 (io), 38 I/O15 (io), 39 I/O16 (io), 40 I/O17 (io), 41 I/O18 (io), 42 I/O19 (io), 43 I/O20 (io), 44 I/O21 (io), 45 I/O22 (io), 46 I/O23 (io), 47 VCC (power), 48 TMS/IN1 (in), 49 NC, 50 GND (power), 51 I/O24 (io), 52 I/O25 (io), 53 I/O26 (io), 54 I/O27 (io), 55 I/O28 (io), 56 I/O29 (io), 57 I/O30 (io), 58 I/O31 (io), 59 I/O32 (io), 60 I/O33 (io), 61 I/O34 (io), 62 I/O35 (io), 63 GND (power), 64 I/O36 (io), 65 I/O37 (io), 66 VCC (power), 67 I/O38 (io), 68 I/O39 (io), 69 I/O40 (io), 70 I/O41 (io), 71 I/O42 (io), 72 I/O43 (io), 73 I/O44 (io), 74 I/O45 (io), 75 I/O46 (io), 76 I/O47 (io), 77 TCK/IN3 (in), 78 Y2 (in), 79 GND (power), 80 GOE0 (in), 81 VCC (power), 82 NC, 83 Y1 (in), 84 IN4 (in), 85 I/O48 (io), 86 I/O49 (io), 87 I/O50 (io), 88 I/O51 (io), 89 I/O52 (io), 90 I/O53 (io), 91 I/O54 (io), 92 I/O55 (io), 93 I/O56 (io), 94 I/O57 (io), 95 VCC (power), 96 I/O58 (io), 97 I/O59 (io), 98 GND (power), 99 I/O60 (io), 100 I/O61 (io), 101 I/O62 (io), 102 I/O63 (io), 103 I/O64 (io), 104 I/O65 (io), 105 I/O66 (io), 106 I/O67 (io), 107 I/O68 (io), 108 I/O69 (io), 109 I/O70 (io), 110 I/O71 (io), 111 GND (power), 112 TDO/IN2 (io), 113 IN5 (in), 114 VCC (power), 115 I/O72 (io), 116 I/O73 (io), 117 I/O74 (io), 118 I/O75 (io), 119 I/O76 (io), 120 I/O77 (io), 121 I/O78 (io), 122 I/O79 (io), 123 I/O80 (io), 124 I/O81 (io), 125 I/O82 (io), 126 I/O83 (io), 127 GND (power), 128 I/O84 (io)

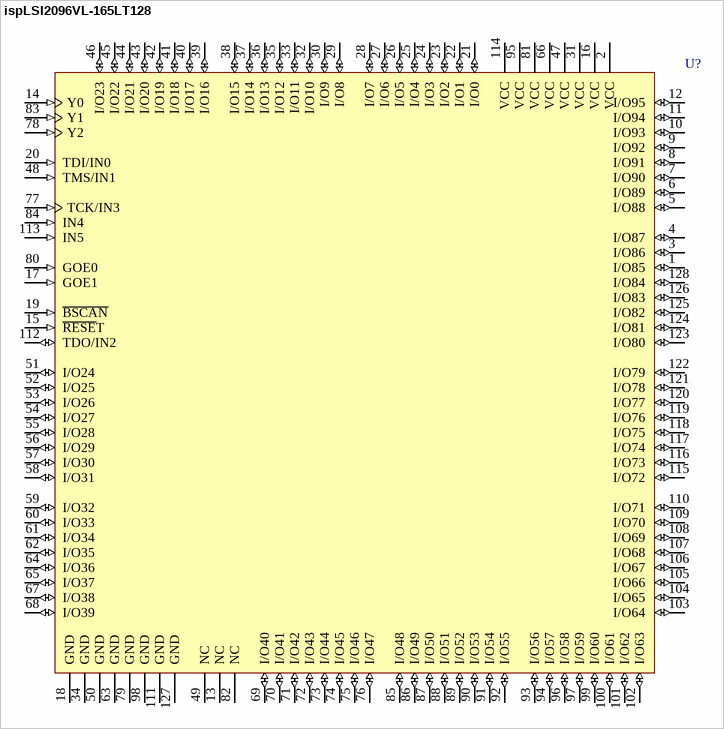
[diagram p74: symbol ispLSI2096VL-165LT128]